# Altium footprint library Dr.Xiong_20160818.PcbLib: 266 footprints (part 2 of 17)
Each footprint in its own frame and in the unit in brackets; x right, y up, seen from the top. Pads: shape width x height; smd on the part's side, far side on the other; paste and mask are expansions set on the pad; w line width, h text height; cw(c..) or ccw(c..) is an arc to the next point about the centre after c.
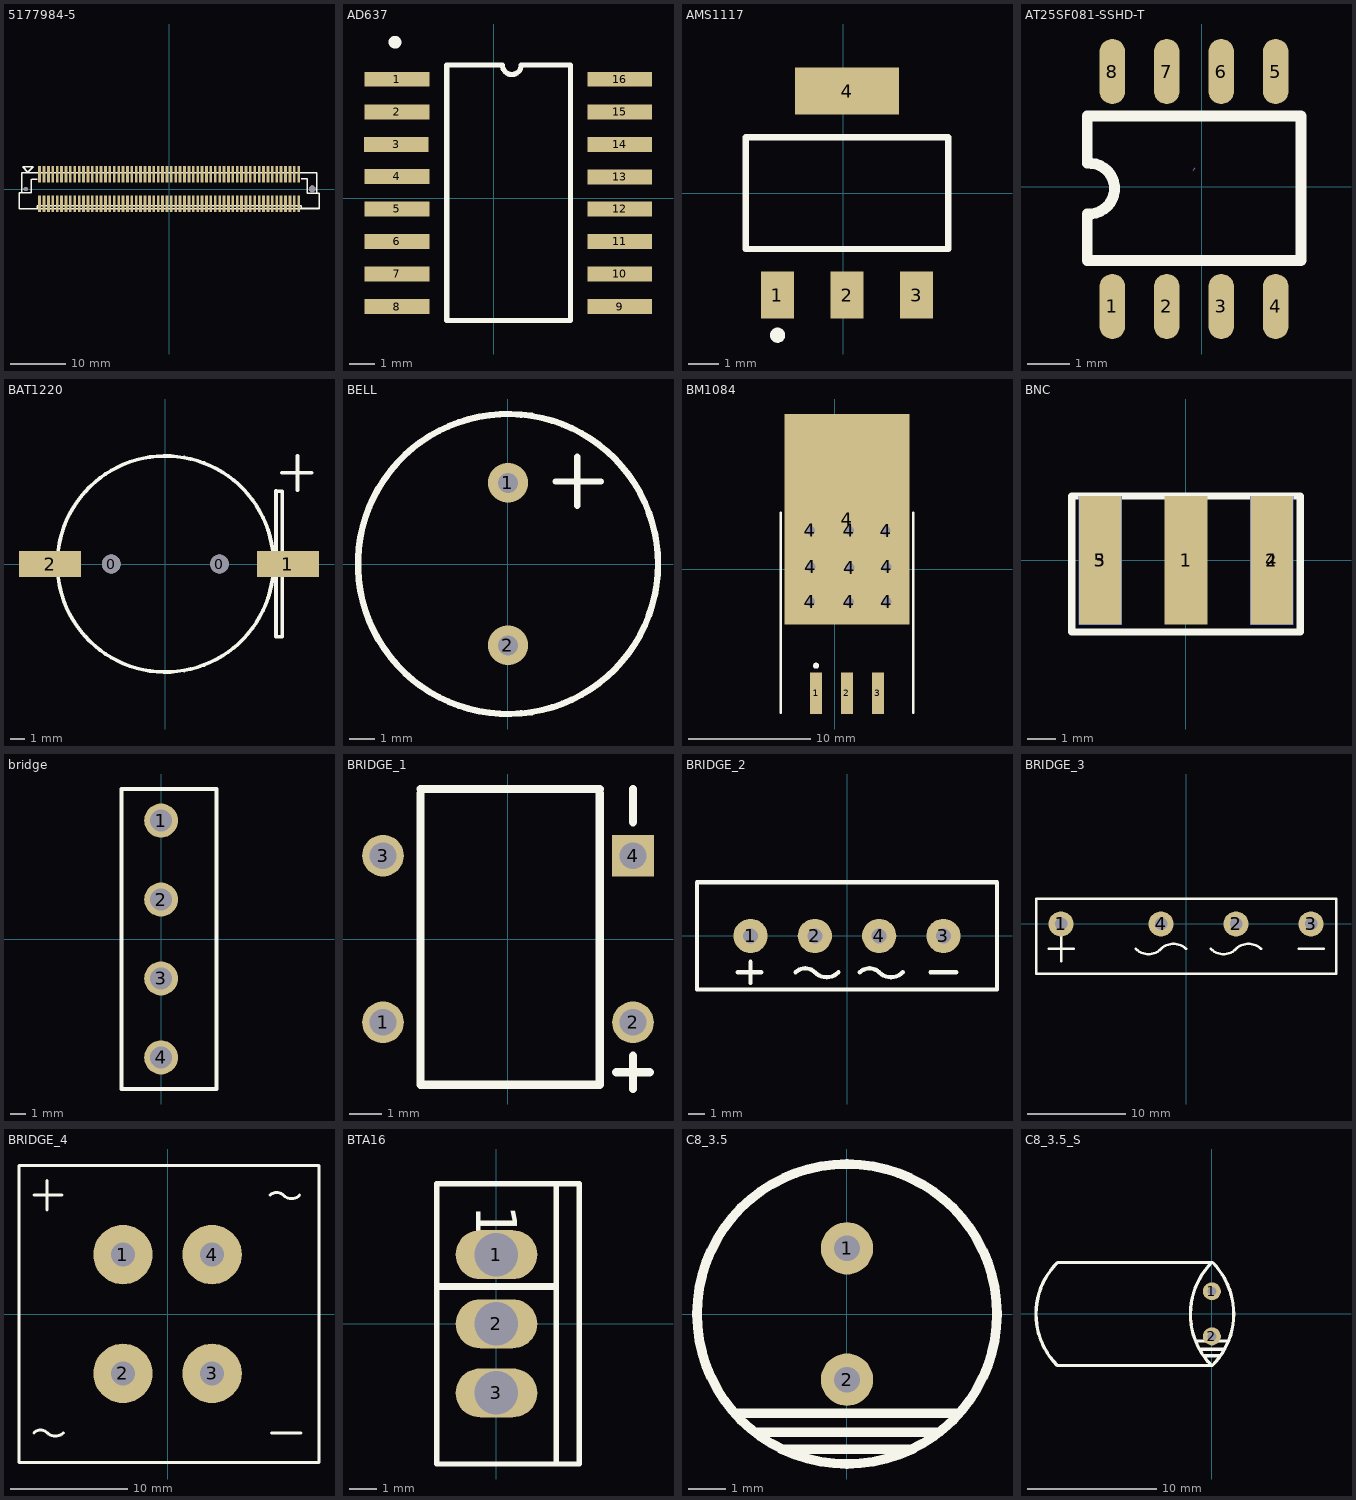
[diagram p1: the footprints below, top view; thin cyan lines are the x and y axes]

## 5177984-5 [mm]
pads (120):
  rect 0.5x3 smd: 1(-23.6,2.7) 2(-23.6,-2.7) 3(-22.8,2.7) 4(-22.8,-2.7) 5(-22,2.7) 6(-22,-2.7) 7(-21.2,2.7) 8(-21.2,-2.7) 9(-20.4,2.7) 10(-20.4,-2.7) 11(-19.6,2.7) 12(-19.6,-2.7) 13(-18.8,2.7) 14(-18.8,-2.7) 15(-18,2.7) 16(-18,-2.7) 17(-17.2,2.7) 18(-17.2,-2.7) 19(-16.4,2.7) 20(-16.4,-2.7) 21(-15.6,2.7) 22(-15.6,-2.7) 23(-14.8,2.7) 24(-14.8,-2.7) 25(-14,2.7) 26(-14,-2.7) 27(-13.2,2.7) 28(-13.2,-2.7) 29(-12.4,2.7) 30(-12.4,-2.7) 31(-11.6,2.7) 32(-11.6,-2.7) 33(-10.8,2.7) 34(-10.8,-2.7) 35(-10,2.7) 36(-10,-2.7) 37(-9.2,2.7) 38(-9.2,-2.7) 39(-8.4,2.7) 40(-8.4,-2.7) 41(-7.6,2.7) 42(-7.6,-2.7) 43(-6.8,2.7) 44(-6.8,-2.7) 45(-6,2.7) 46(-6,-2.7) 47(-5.2,2.7) 48(-5.2,-2.7) 49(-4.4,2.7) 50(-4.4,-2.7) 51(-3.6,2.7) 52(-3.6,-2.7) 53(-2.8,2.7) 54(-2.8,-2.7) 55(-2,2.7) 56(-2,-2.7) 57(-1.2,2.7) 58(-1.2,-2.7) 59(-0.4,2.7) 60(-0.4,-2.7) 61(0.4,2.7) 62(0.4,-2.7) 63(1.2,2.7) 64(1.2,-2.7) 65(2,2.7) 66(2,-2.7) 67(2.8,2.7) 68(2.8,-2.7) 69(3.6,2.7) 70(3.6,-2.7) 71(4.4,2.7) 72(4.4,-2.7) 73(5.2,2.7) 74(5.2,-2.7) 75(6,2.7) 76(6,-2.7) 77(6.8,2.7) 78(6.8,-2.7) 79(7.6,2.7) 80(7.6,-2.7) 81(8.4,2.7) 82(8.4,-2.7) 83(9.2,2.7) 84(9.2,-2.7) 85(10,2.7) 86(10,-2.7) 87(10.8,2.7) 88(10.8,-2.7) 89(11.6,2.7) 90(11.6,-2.7) 91(12.4,2.7) 92(12.4,-2.7) 93(13.2,2.7) 94(13.2,-2.7) 95(14,2.7) 96(14,-2.7) 97(14.8,2.7) 98(14.8,-2.7) 99(15.6,2.7) 100(15.6,-2.7) 101(16.4,2.7) 102(16.4,-2.7) 103(17.2,2.7) 104(17.2,-2.7) 105(18,2.7) 106(18,-2.7) 107(18.8,2.7) 108(18.8,-2.7) 109(19.6,2.7) 110(19.6,-2.7) 111(20.4,2.7) 112(20.4,-2.7) 113(21.2,2.7) 114(21.2,-2.7) 115(22,2.7) 116(22,-2.7) 117(22.8,2.7) 118(22.8,-2.7) 119(23.6,2.7) 120(23.6,-2.7)
via 26.1,0 diameter 1.2 hole 1.2
via -26.1,0 diameter 0.8 hole 0.8
Top Overlay:
  lines w0.254: -26.9,-3.605 -26.899,-3.607 -24.054,-3.607 ; -26.848,-3.607 -27.356,-3.607 -27.356,-0.737 -27.28,-0.66 -27.153,-0.66 -26.619,-0.66 ; -26.695,4.039 -25.73,3.073 ; -26.695,4.064 -24.714,4.064 -25.679,3.099 ; -25.121,-0.635 -25.095,-0.66 -26.9,-0.66 -26.9,3 26.872,3 ; -25.095,-0.61 -25.095,1.778 ; -25.044,1.778 -24.028,1.778 ; 24.028,-3.531 24.028,-3.048 -24.054,-3.048 -24.054,-3.607 ; 24.054,-3.531 26.873,-3.531 ; 24.079,1.829 25.146,1.829 25.171,1.778 25.171,-0.787 25.171,-0.813 26.9,-0.813 26.9,3 ; 26.518,-0.813 27.229,-0.813 27.305,-0.889 27.305,-3.48 ; 26.594,-3.531 27.28,-3.531 ; 27.305,-3.2 27.305,-3.581 27.28,-3.607 -24.054,-3.607

## AD637 [mm]
pads (16):
  rect 2.54x0.584 smd: 1(-3.8,4.65) 2(-3.8,3.375) 3(-3.825,2.1) 4(-3.8,0.85) 5(-3.8,-0.425) 6(-3.8,-1.7) 7(-3.8,-2.975) 8(-3.8,-4.25) 9(4.925,-4.25) 10(4.925,-2.975) 11(4.925,-1.7) 12(4.925,-0.425) 13(4.925,0.825) 14(4.925,2.1) 15(4.925,3.375) 16(4.925,4.65)
Top Overlay:
  circle w0.25: c-3.875,6.1 r0.125
  lines w0.2: -1.85,-4.8 -1.85,5.2 0.333,5.2 ccw(c0.7,5.2) 1.067,5.2 3,5.2 3,-4.8 -1.85,-4.8

## AMS1117 [mm]
pads (4):
  rect 1.1x1.55 smd: 1(-2.173,-3.375) 2(0.127,-3.375) 3(2.427,-3.375)
  rect 3.45x1.55 smd: 4(0.127,3.375)
Top Overlay:
  circle w0.25: c-2.173,-4.7 r0.125
  lines w0.2: -3.223,-1.85 3.477,-1.85 3.477,1.85 -3.223,1.85 -3.223,-1.85

## AT25SF081-SSHD-T [mm]
pads (8):
  oval 0.6x1.518 smd: 1(-2.082,-2.797) 2(-0.812,-2.797) 3(0.458,-2.797) 4(1.728,-2.797) 5(1.728,2.683) 6(0.458,2.683) 7(-0.812,2.683) 8(-2.082,2.683)
Top Overlay:
  lines w0.254: -2.667,-1.728 2.323,-1.728 2.323,1.643 -2.667,1.643 -2.667,0.543 cw(c-2.622,-0.047) -2.667,-0.637 -2.667,-1.728
Mechanical 15:
  lines w0.003: -0.197,0.384 -0.147,0.435

## BAT1220 [mm]
pads (4):
  round 1.3 hole 1.3: 0(-3.75,0) 0(3.75,0)
  rect 4.32x1.8 all layers, no hole: 1(8.5,0) 2(-8,0)
Top Overlay:
  circle w0.254: c0,0 r7.5
  lines w0.254: 8.077,6.325 10.135,6.325 ; 9.169,5.131 9.169,7.493 ; 7.671,-5.029 7.696,-5.055 8.103,-5.055 8.103,5.055 7.696,5.055 7.671,5.08 7.671,-5.029

## BELL [mm]
pads (2):
  round 1.6 hole 0.8: 1(0,3.25) 2(0,-3.25)
Top Overlay:
  circle w0.254: c0,0 r6
  lines w0.254: 1.905,3.302 3.708,3.302 ; 2.769,2.337 2.769,4.293

## BM1084 [mil]
pads (13):
  rect 39.37x133.86 smd: 1(-60,-399.46) 2(40,-399.95) 3(140,-399.46)
  rect 80x80 hole 30: 4(-78,-104) 4(-78,126) 4(-77,9) 4(47,-105) 4(48,126) 4(49,6) 4(166,125) 4(168,-104) 4(168,8)
  rect 403.54x680 smd: 4(40,162)
Top Overlay:
  circle w9.84: c-60,-310.88 r4.92
  lines w7.87: -173.58,-462.45 -173.58,183.21 ; 253.58,-462.45 253.58,183.21

## BNC [mil]
pads (5):
  rect 60x180 smd: 1(0,0) 2(120,0) 3(-120,0)
  rect 60x180 smd far side: 4(120,0) 5(-120,0)
Top Overlay:
  lines w10: -160,-100 160,-100 160,90 -160,90 -160,-100

## bridge [mil]
pads (4):
  round 86 hole 56: 1(0,300) 2(0,100) 3(0,-100) 4(0,-300)
Top Overlay:
  lines w10: -100,-380 -100,380 0,380 140,380 140,0 140,-380 -100,-380

## BRIDGE_1 [mil]
pads (4):
  round 50 hole 32: 1(-150,-100) 2(150,-100) 3(-150,100)
  rect 50x50 hole 32: 4(150,100)
Top Overlay:
  lines w10: -105,175 -105,-175 110,-175 110,175 ; -105,180 110,180 ; 130,-160 140,-160 170,-160 ; 150,-180 150,-140 ; 150,140 150,180

## BRIDGE_2 [mil]
pads (4):
  round 80 hole 35: 1(-225,0) 2(-75,0) 3(225,0) 4(75,0)
Top Overlay:
  lines w10: -255,-85 -200,-85 ; -225,-110 -225,-60 ; -120,-85 cw(c-97.5,-107.5) -75,-85 ccw(c-47.5,-57.5) -20,-85 ; 30,-85 cw(c52.5,-107.5) 75,-85 ccw(c102.5,-57.5) 130,-85 ; 195,-85 255,-85 ; -350,-125 -225,-125 350,-125 350,125 -350,125 -350,-125

## BRIDGE_3 [mm]
pads (4):
  round 2.54 hole 1.27: 1(-12.7,0) 2(5.08,0) 3(12.7,0) 4(-2.54,0)
Top Overlay:
  lines w0.254: -13.97,-2.54 -11.43,-2.54 ; -12.7,-3.81 -12.7,-1.27 ; -5.08,-2.54 ccw(c-3.81,-1.27) -2.54,-2.54 cw(c-1.27,-3.81) 0,-2.54 ; 2.54,-2.54 ccw(c3.81,-1.27) 5.08,-2.54 cw(c6.35,-3.81) 7.62,-2.54 ; 11.43,-2.54 13.97,-2.54 ; -15.24,-5.08 -15.24,2.54 15.24,2.54 15.24,-5.08 -15.24,-5.08

## BRIDGE_4 [mil]
pads (4):
  round 200 hole 80: 1(-150,200) 2(-150,-200) 3(150,-200) 4(150,200)
Top Overlay:
  lines w10: -450,-400 cw(c-427.5,-422.5) -405,-400 ccw(c-377.5,-372.5) -350,-400 ; -450,400 -355,400 ; -405,350 -405,450 ; 345,400 cw(c367.5,377.5) 390,400 ccw(c417.5,427.5) 445,400 ; 350,-400 450,-400 ; -500,-500 -500,200 -500,500 510,500 510,-500 -500,-500

## BTA16 [mm]
pads (3):
  oval 3x1.8 hole 1.6: 1(0,2.54) 2(0,0) 3(0,-2.54)
Top Overlay:
  lines w0.2: 2.2,-5.15 2.2,5.15 ; -2.2,-5.15 -2.2,5.15 3.048,5.15 3.048,-5.15 -2.2,-5.15
  lines w0.254: -2.159,1.346 -2.134,1.372 2.159,1.372
  text "1" at -0.737,4.369 h1.5

## C8_3.5 [mil]
pads (2):
  round 55 hole 27: 1(0,68.9) 2(0,-68.9)
Top Overlay:
  circle w10: c0,0 r157.48
  lines w10: -117,-104 117,-104 ; -94,-124 97,-124 98,-123 ; -69,-142 69,-142 70,-141

## C8_3.5_S [mil]
pads (2):
  round 55 hole 27: 1(0,68.9) 2(0,-68.9)
Top Overlay:
  lines w10: -474,-157 cw(c-316.22,-0.78) -472.44,157 0,157 ccw(c157,-1) -1,-158 ; -472.44,-158 1,-158 ccw(c-156,0) 2,157 ; -49,-83 50,-83 ; -36,-108 36,-108 37,-109 ; -24,-128 24,-128 25,-129